# Altium footprint library General.PcbLib: 246 footprints (part 2 of 16)
Each footprint in its own frame and in the unit in brackets; x right, y up, seen from the top. Pads: shape width x height; smd on the part's side, far side on the other; paste and mask are expansions set on the pad; w line width, h text height; cw(c..) or ccw(c..) is an arc to the next point about the centre after c.
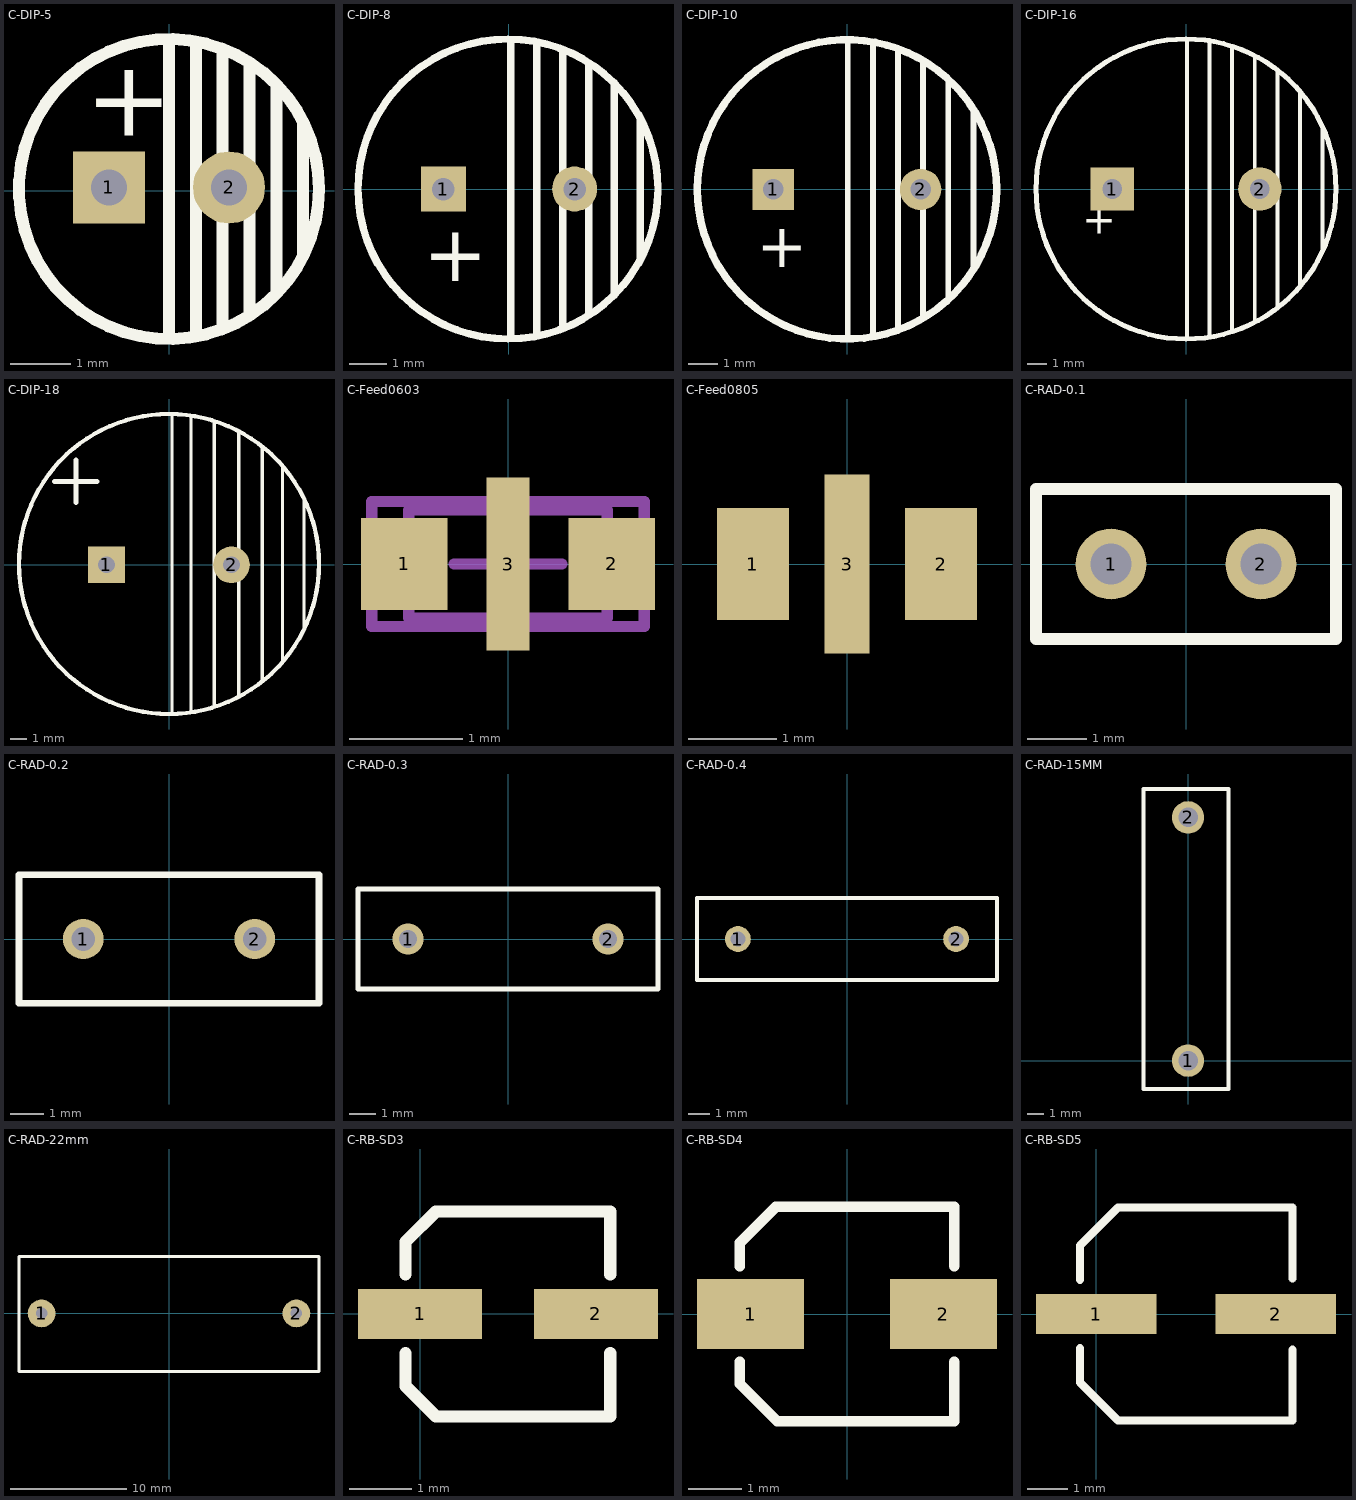
[diagram p1: the footprints below, top view; thin cyan lines are the x and y axes]

## C-DIP-5 [mm] "2.5*5*11mm  22uF/50V"
pads (2):
  rect 1.2x1.2 hole 0.6: 1(-1,0.051)
  round 1.2 hole 0.6: 2(1,0.051)
Top Overlay:
  circle w0.2: c0,0.025 r2.5
  lines w0.2: 0,-2.464 0,2.489 ; 0.447,-2.413 0.447,2.464 ; 0.894,-2.261 0.894,2.362 ; 1.341,-2.007 1.341,2.057 ; 1.788,-1.651 1.788,1.753 ; 2.235,-1.067 2.235,1.092
  text "+" at -1.397,0.914 h1.27
3D body "User Library-cap 5x11.STEP": height 11, standoff -19, extent -2.5,-2.485 2.5,2.515

## C-DIP-8 [mm] "3.5*8*12mm  470uF/25V"
height 12
pads (2):
  rect 1.2x1.2 hole 0.6: 1(-1.75,0)
  round 1.2 hole 0.6: 2(1.75,0)
Top Overlay:
  circle w0.2: c-0.025,0 r4
  lines w0.2: 0.051,-3.937 0.051,3.962 ; 0.742,-3.912 0.742,3.912 ; 1.433,-3.683 1.433,3.708 ; 2.123,-3.302 2.123,3.327 ; 2.814,-2.794 2.814,2.819 ; 3.505,-1.803 3.505,1.88
  text "+" at -2.282,-2.464 h1.5
3D body "SW3dPS-Cap electro 8x11.5x3.5mm.STEP": height 11.83, standoff -3.68, extent -4.025,-4.026 4.025,4.025

## C-DIP-10 [mm] "5*10*17mm  470uF/35V 1000uF/25V"
height 17
pads (2):
  rect 1.4x1.4 hole 0.7: 1(-2.5,0)
  round 1.4 hole 0.7: 2(2.5,0)
Top Overlay:
  circle w0.254: c0,0 r5.08
  lines w0.2: 0.025,-5.055 0.025,5.105 ; 0.879,-4.953 0.879,4.978 ; 1.732,-4.674 1.732,4.75 ; 2.586,-4.267 2.586,4.293 ; 3.439,-3.632 3.439,3.708 ; 4.293,-2.667 4.293,2.667
  text "+" at -3.07,-2.642 h1.5
3D body "CAP 101.STEP": height 13, standoff -13.8, extent -5.4,-5.4 5.41,5.4

## C-DIP-16 [mm] "7.5*15*25mm  2200uF/35V"
pads (2):
  rect 2.2x2.2 hole 1: 1(-3.75,0)
  round 2.2 hole 1: 2(3.75,0)
Top Overlay:
  circle w0.254: c0,0 r7.62
  lines w0.2: 0.051,-7.595 0.051,7.595 ; 1.198,-7.442 1.198,7.569 ; 2.345,-7.239 2.345,7.188 ; 3.492,-6.706 3.492,6.782 ; 4.64,-5.918 4.64,5.994 ; 5.787,-4.877 5.787,4.953 ; 6.934,-3.175 6.934,3.073
  text "+" at -3.556,-0.965 h1.5
3D body "35V2200UF.STEP": height 26, standoff -3, extent -8,-8 8,8

## C-DIP-18 [mm] "10*20*31.5mm  4700uF/50V"
height 31.5
pads (2):
  rect 2.2x2.2 hole 1: 1(-3.75,0)
  round 2.2 hole 1: 2(3.75,0)
Top Overlay:
  circle w0.254: c0,0.051 r9
  lines w0.2: 0.178,-8.941 0.178,9.042 ; 1.321,-8.763 1.321,8.915 ; 2.718,-8.484 2.718,8.534 ; 4.191,-7.798 4.191,7.95 ; 5.588,-6.96 5.588,6.96 ; 6.807,-5.74 6.807,5.918 ; 8.103,-3.81 8.103,3.962
  lines w0.305: -6.858,5.004 -4.318,5.004 ; -5.588,3.734 -5.588,6.274
3D body "User Library-CE_R300_D720_H1600.STEP": height 41.36, standoff -2.78, extent -9.14,-9.138 9.14,9.138

## C-Feed0603 [mil] "穿芯电容 SMD 0603 (1608)  低密度"
height 36
pads (3):
  rect 30x32 smd: 1(-36,0) 2(36,0)
  rect 15x60 smd: 3(0,0)
Mechanical 13:
  lines w3.94: -34.45,-18.7 34.45,-18.7 34.45,18.7 -34.45,18.7 -34.45,-18.7
Mechanical 15:
  lines w3.94: -18.7,0 18.7,0 ; 0,-18.7 0,18.7 ; -47.24,-21.65 47.24,-21.65 47.24,21.65 -47.24,21.65 -47.24,-21.65
3D body "User Library-EMIFIL_0603.step": height 23.77, standoff 0, extent -31.49,-16.11 31.5,16.12

## C-Feed0805 [mil] "穿芯电容0805-低密度"
height 27.56
pads (3):
  rect 32x50 smd: 1(-42,0) 2(42,0)
  rect 20x80 smd: 3(0,0)
3D body "User Library-X2Y_0805_(X15).STEP": height 40.04, standoff -0.04, extent -40,-25.04 40,25.04

## C-RAD-0.1 [mm] "Radial Cap, Thru-Hole; 2 Leads; 100mil(2.54mm) in Pin Spacing"
pads (2):
  round 1.2 hole 0.7: 1(-1.27,0) 2(1.27,0)
Top Overlay:
  lines w0.2: -2.54,-1.27 -2.54,1.27 2.54,1.27 2.54,-1.27 -2.54,-1.27
3D body "User Library-cap2_54mm.step": height 4.8, standoff -4.2, extent -2.345,-1.075 2.295,1.025

## C-RAD-0.2 [mm] "Radial Cap, Thru-Hole; 2 Leads; 200mil(5.08mm) in Pin Spacing"
pads (2):
  round 1.2 hole 0.7: 1(-2.54,0) 2(2.54,0)
Top Overlay:
  lines w0.2: -4.445,-1.905 -4.445,1.905 4.445,1.905 4.445,-1.905 -4.445,-1.905
3D body "User Library-6mm radial ceramic disc capacitor.STEP": height 8.5, standoff -25.12, extent -3,-1.9 3,1.9

## C-RAD-0.3 [mm] "Radial Cap, Thru-Hole; 2 Leads; 0.3 in Pin Spacing"
height 6
pads (2):
  round 1.2 hole 0.7: 1(-3.81,0) 2(3.81,0)
Top Overlay:
  lines w0.2: -5.715,-1.905 5.715,-1.905 5.715,1.905 -5.715,1.905 -5.715,-1.905

## C-RAD-0.4 [mm] "Radial Cap, Thru-Hole; 2 Leads; 0.4 in Pin Spacing"
pads (2):
  round 1.2 hole 0.7: 1(-5.08,0) 2(5.08,0)
Top Overlay:
  lines w0.2: -6.985,-1.905 -6.985,1.905 6.985,1.905 6.985,-1.905 -6.985,-1.905

## C-RAD-15MM [mm] "Radial Cap, Thru-Hole; 2 Leads; 15mm in Pin Spacing"
height 0.6
pads (2):
  round 2 hole 1.2: 1(0,0) 2(0,15)
Top Overlay:
  lines w0.254: -2.75,-1.75 -2.75,16.75 2.5,16.75 2.5,-1.75 -2.75,-1.75
3D body: height 13, standoff 0, extent -2.75,-1.75 2.6,16.75

## C-RAD-22mm [mm] "Radial Cap, Thru-Hole; 2 Leads; 22mm in Pin Spacing"
pads (2):
  round 2.4 hole 1: 1(-11,0) 2(11,0)
Top Overlay:
  lines w0.254: -12.954,-5.029 -12.954,4.928 12.954,4.928 12.954,-5.029 -12.954,-5.029
3D body "C10x26.STEP": height 1.5, standoff -19.5, extent -12.954,-5 13.046,5

## C-RB-SD3 [mm]
pads (2):
  rect 2x0.8 smd: 1(0,0) 2(2.835,0)
Top Overlay:
  lines w0.2: -0.234,-0.635 -0.234,-1.163 0.256,-1.653 3.059,-1.653 ; -0.234,0.635 -0.234,1.163 0.254,1.651 3.066,1.651 3.066,0.635 ; 3.066,-1.647 3.066,-0.635
3D body "User Library-ALU-A.STEP": height 5.4, standoff 0, extent -0.378,-1.65 3.222,1.65

## C-RB-SD4 [mm] "贴片铝电解"
height 7
pads (2):
  rect 2x1.3 smd: 1(-1.8,0) 2(1.8,0)
Top Overlay:
  lines w0.2: -2,-0.889 -2,-1.302 -1.302,-2 2,-2 2,-0.896 ; -2,0.889 -2,1.327 -1.327,2 2,2 2,0.896
3D body "SL-B.STEP": height 5.2, standoff 0, extent -2.3,-2.15 2.3,2.15

## C-RB-SD5 [mm]
pads (2):
  rect 3x1 smd: 1(0,0) 2(4.477,0)
Top Overlay:
  lines w0.203: -0.407,-0.852 -0.407,-1.706 ; -0.407,0.854 -0.407,1.707 0.541,2.655 0.542,2.656 4.89,2.656 ; 0.217,-2.33 -0.407,-1.706 ; 4.891,-2.654 0.542,-2.654 0.542,-2.654 -0.407,-1.706 ; 4.892,-2.654 4.892,-0.889 ; 4.892,0.889 4.892,2.654
3D body "SL-D.STEP": height 5.2, standoff 0, extent -0.545,-2.591 5.055,2.709